# Altium footprint library iuh-thuc-hanh.PcbLib: 72 footprints (part 5 of 5)
Each footprint in its own frame and in the unit in brackets; x right, y up, seen from the top. Pads: shape width x height; smd on the part's side, far side on the other; paste and mask are expansions set on the pad; w line width, h text height; cw(c..) or ccw(c..) is an arc to the next point about the centre after c.
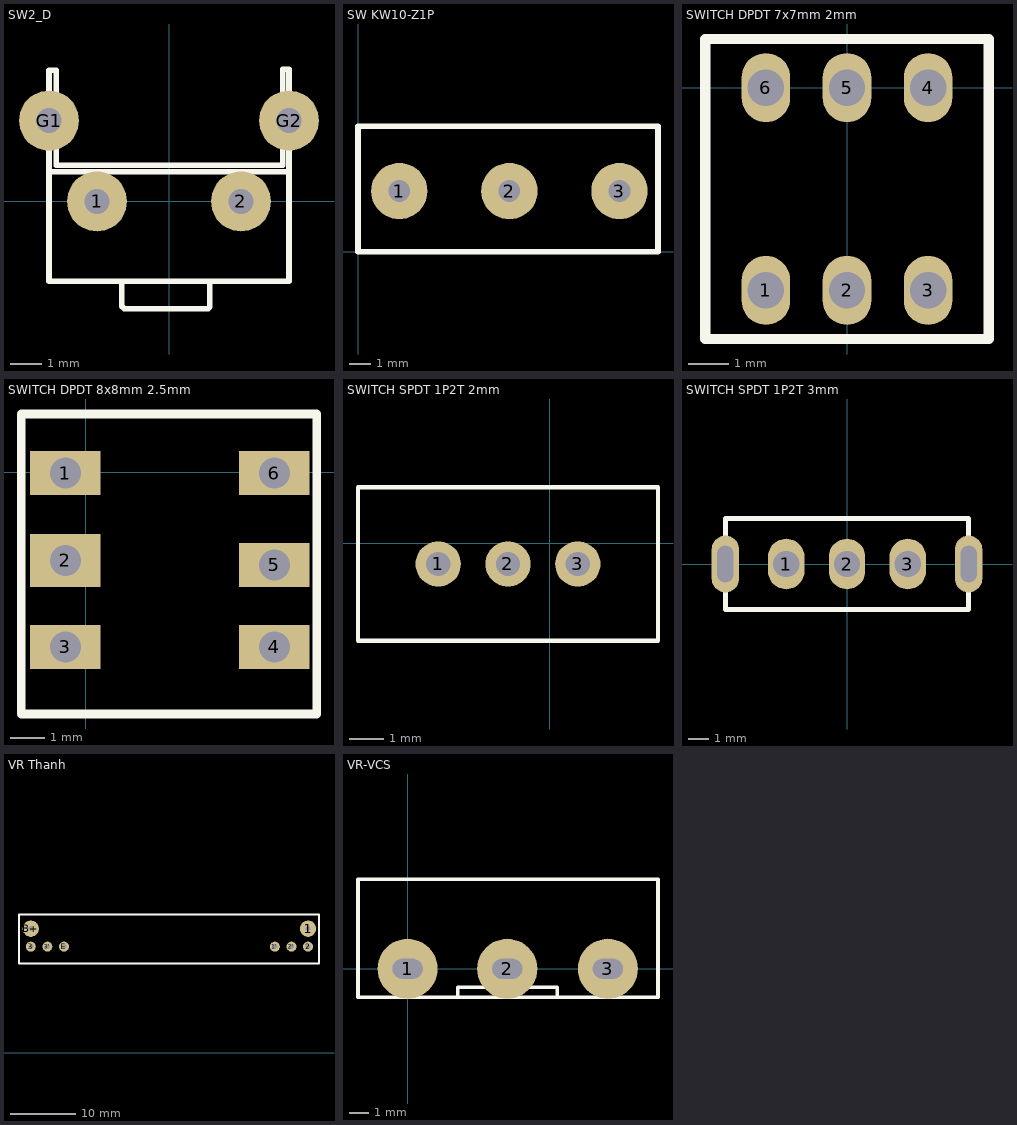
[diagram p4: the footprints below, top view; thin cyan lines are the x and y axes]

## SW2_D [mil] "SW button 2pin, 300x 300 x 250 mil"
height 100
pads (4):
  round 75 hole 31: 1(-90,0) 2(90,0) G1(-150,101) G2(150,101)
Top Overlay:
  lines w7: -150,37 150,37 ; -59,-100 -59,-131 -56,-134 49,-134 51,-132 51,-100 ; -150,-100 150,-100 150,165 142,165 142,45 -141,45 -141,164 -150,164 -150,-100

## SW KW10-Z1P [mm]
pads (3):
  round 2.6 hole 1: 1(1.905,2.794) 2(6.985,2.794) 3(12.065,2.794)
Top Overlay:
  lines w0.254: 0,0 0,5.779 13.843,5.779 13.843,0 0,0
3D body "Micro limit switch.STEP": height 11.31, standoff -1.55, extent 0.657,-0.202 14.605,7.948

## SWITCH DPDT 7x7mm 2mm [mm]
pads (6):
  oval 1.2x1.7 hole 0.9: 1(-2,-5) 2(0,-5) 3(2,-5) 4(2,0) 5(0,0) 6(-2,0)
Top Overlay:
  lines w0.254: -3.5,-6.2 3.5,-6.2 3.5,1.2 -3.5,1.2 -3.5,-6.2
3D body "LatchSwitch_7x7.SLDPRT": height 12.4, standoff -3.65, extent -3.5,-6.04 3.5,0.96

## SWITCH DPDT 8x8mm 2.5mm [mil]
pads (6):
  rect 80x50 hole 35: 1(-23,-1) 3(-23,-198) 4(214,-198) 5(214,-105) 6(214,-1)
  rect 80x60 hole 35: 2(-23,-100)
Top Overlay:
  lines w10: -73,-274 -73,66 262,66 262,-274 -73,-274
3D body "User Library-ZIPPY_P1-1S_8x8_Push_switch_lock.STEP": height 524.22, standoff -145.07, extent -62.48,-265.35 252.48,57.48

## SWITCH SPDT 1P2T 2mm [mm] "TE Connectivity SLS121PC04 SPDT slider"
height 10.058
pads (3):
  round 1.3 hole 0.7: 1(-3.2,-0.6) 2(-1.2,-0.6) 3(0.8,-0.6)
Top Overlay:
  lines w0.127: -5.5,-2.8 -5.5,1.6 3.1,1.6 3.1,-2.8 -5.5,-2.8
3D body "Selector Switch - SS12D00.stp": height 7.05, standoff -2.45, extent -5.563,-2.539 3.023,1.169

## SWITCH SPDT 1P2T 3mm [mm]
pads (5):
  oval 1.8x2.5 hole 1.3: 1(-3,0) 2(0,0) 3(3,0)
  oval 1.35x2.8 hole 0.8 slot 1.8 at 90 deg: ""(-6,0) ""(6,0)
Top Overlay:
  lines w0.254: -6,-2.25 6,-2.25 6,2.25 -6,2.25 -6,-2.25
3D body "Slide Switch SLS121PC04.STEP": height 10.01, standoff -4.32, extent -5.499,-2.794 5.499,2.794

## VR Thanh [mil]
pads (8):
  round 98.43 hole 30: 1(1880,748.27) B+(210,748.27)
  round 60 hole 30: 1'(1680,640) 2(1880,640) 2'(1780,640) 3(210,640) 3'(310,640) E(410,640)
Top Overlay:
  lines w10: 139,538 139,834 1946,834 1946,538 1852,538 139,538

## VR-VCS [mil] "Volumn control single"
pads (3):
  round 120 hole 40 slot 60 at 0 deg: 1(0,0) 2(199,0) 3(400,0)
Top Overlay:
  lines w7: 100,-57 100,-37 299,-37 299,-57 ; -99,-57 500,-57 500,179 -99,179 -99,-57
3D body "SW3dPS-Pot.STEP": height 839.35, standoff -130, extent -110,-818.11 510,188.11